# Altium footprint library Generic Footprint.PcbLib: 160 footprints (part 14 of 20) (continued)
## Symbol_FCC-Logo-1.5x1mm_silkscreen [mm] (continued)
1(0.814,0.325) 1(0.814,0.326) 1(0.814,0.328) 1(0.814,0.33) 1(0.814,0.748) 1(0.814,0.75) 1(0.814,0.753) 1(0.814,0.84) 1(0.814,0.843) 1(0.814,0.994) 1(0.814,0.998) 1(0.816,0.078) 1(0.816,0.082) 1(0.816,0.233) 1(0.816,0.235) 1(0.816,0.323) 1(0.816,0.325) 1(0.816,0.328) 1(0.816,0.75) 1(0.816,0.753) 1(0.816,0.755) 1(0.816,0.845) 1(0.816,0.996) 1(0.816,0.998) 1(0.816,1) 1(0.818,0.076) 1(0.818,0.082) 1(0.818,0.231) 1(0.818,0.233) 1(0.818,0.236) 1(0.818,0.321) 1(0.818,0.323) 1(0.818,0.325) 1(0.818,0.326) 1(0.818,0.753) 1(0.818,0.755) 1(0.818,0.756) 1(0.818,0.841) 1(0.818,0.843) 1(0.818,0.845) 1(0.818,0.996) 1(0.818,0.998) 1(0.819,0.078) 1(0.819,0.08) 1(0.819,0.229) 1(0.819,0.231) 1(0.819,0.233) 1(0.819,0.235) 1(0.819,0.32) 1(0.819,0.758) 1(0.819,0.843) 1(0.819,0.848) 1(0.819,0.998) 1(0.819,1) 1(0.819,1.001) 1(0.821,0.08) 1(0.821,0.228) 1(0.821,0.229) 1(0.821,0.231) 1(0.821,0.318) 1(0.821,0.321) 1(0.821,0.323) 1(0.821,0.755) 1(0.821,0.756) 1(0.821,0.76) 1(0.821,0.845) 1(0.821,0.848) 1(0.821,0.998) 1(0.823,0.075) 1(0.823,0.076) 1(0.823,0.078) 1(0.823,0.314) 1(0.823,0.316) 1(0.823,0.321) 1(0.823,0.756) 1(0.823,0.758) 1(0.823,0.76) 1(0.823,0.762) 1(0.823,1) 1(0.823,1.001) 1(0.823,1.003) 1(0.824,0.228) 1(0.824,0.313) 1(0.824,0.316) 1(0.824,0.758) 1(0.824,0.762) 1(0.824,0.763) 1(0.824,0.847) 1(0.826,0.229) 1(0.826,0.314) 1(0.826,0.316) 1(0.826,0.76) 1(0.826,0.762) 1(0.826,0.763) 1(0.826,0.765) 1(0.826,0.848) 1(0.826,1.001) 1(0.826,1.003) 1(0.826,1.005) 1(0.828,0.073) 1(0.828,0.075) 1(0.828,0.076) 1(0.828,0.311) 1(0.828,0.313) 1(0.828,0.767) 1(0.828,0.852) 1(0.83,0.228) 1(0.83,0.309) 1(0.83,0.311) 1(0.83,0.314) 1(0.83,0.763) 1(0.83,0.765) 1(0.83,0.768) 1(0.83,0.85) 1(0.83,0.852) 1(0.83,0.853) 1(0.83,1.003) 1(0.83,1.006) 1(0.831,0.071) 1(0.831,0.075) 1(0.831,0.226) 1(0.831,0.308) 1(0.831,0.309) 1(0.831,0.313) 1(0.831,0.765) 1(0.831,0.767) 1(0.831,0.77) 1(0.831,0.852) 1(0.831,0.853) 1(0.831,0.857) 1(0.833,0.073) 1(0.833,0.224) 1(0.833,0.306) 1(0.833,0.308) 1(0.833,0.311) 1(0.833,0.767) 1(0.833,0.77) 1(0.833,0.772) 1(0.833,0.853) 1(0.835,0.07) 1(0.835,0.073) 1(0.835,0.219) 1(0.835,0.304) 1(0.835,0.306) 1(0.835,0.308) 1(0.835,0.309) 1(0.835,0.77) 1(0.835,0.772) 1(0.835,0.773) 1(0.835,0.857) 1(0.835,0.858) 1(0.835,1.008) 1(0.836,0.068) 1(0.836,0.223) 1(0.836,0.303) 1(0.836,0.775) 1(0.836,0.855) 1(0.838,0.218) 1(0.838,0.219) 1(0.838,0.221) 1(0.838,0.304) 1(0.838,0.306) 1(0.838,0.772) 1(0.838,0.773) 1(0.838,0.857) 1(0.838,0.858) 1(0.838,0.86) 1(0.838,1.01) 1(0.84,0.066) 1(0.84,0.216) 1(0.84,0.299) 1(0.84,0.301) 1(0.84,0.303) 1(0.84,1.008) 1(0.841,0.216) 1(0.841,0.218) 1(0.841,0.219) 1(0.841,0.303) 1(0.841,0.304) 1(0.841,0.773) 1(0.841,0.775) 1(0.841,0.779) 1(0.841,0.858) 1(0.841,0.86) 1(0.841,1.008) 1(0.843,0.212) 1(0.843,0.218) 1(0.843,0.297) 1(0.843,0.299) 1(0.843,0.775) 1(0.843,0.777) 1(0.843,0.779) 1(0.843,0.78) 1(0.843,1.01) 1(0.843,1.011) 1(0.845,0.068) 1(0.845,0.296) 1(0.845,0.297) 1(0.845,0.782) 1(0.845,0.86) 1(0.846,0.065) 1(0.846,0.068) 1(0.846,0.212) 1(0.846,0.216) 1(0.846,0.299) 1(0.846,0.779) 1(0.846,0.78) 1(0.846,0.784) 1(0.846,0.862) 1(0.848,0.066) 1(0.848,0.211) 1(0.848,0.294) 1(0.848,0.297) 1(0.848,0.78) 1(0.848,0.782) 1(0.848,1.01) 1(0.848,1.011) 1(0.848,1.013) 1(0.85,0.214) 1(0.85,0.292) 1(0.85,0.296) 1(0.85,0.782) 1(0.85,0.785) 1(0.85,0.863) 1(0.85,0.867) 1(0.852,0.211) 1(0.852,0.289) 1(0.852,0.291) 1(0.852,0.292) 1(0.852,0.294) 1(0.852,0.296) 1(0.852,0.787) 1(0.852,0.867) 1(0.852,0.869) 1(0.852,1.011) 1(0.852,1.013) 1(0.852,1.015) 1(0.853,0.063) 1(0.853,0.066) 1(0.853,0.212) 1(0.853,0.294) 1(0.853,0.789) 1(0.853,0.865) 1(0.855,0.061) 1(0.855,0.065) 1(0.855,0.211) 1(0.855,0.287) 1(0.855,0.292) 1(0.855,0.787) 1(0.855,0.869) 1(0.855,1.017) 1(0.857,0.061) 1(0.857,0.065) 1(0.857,0.52) 1(0.857,0.522) 1(0.857,0.524) 1(0.857,0.525) 1(0.857,0.527) 1(0.857,0.529) 1(0.857,0.53) 1(0.857,0.532) 1(0.857,0.534) 1(0.857,0.535) 1(0.857,0.537) 1(0.857,0.539) 1(0.857,0.54) 1(0.857,0.542) 1(0.857,0.544) 1(0.857,0.546) 1(0.857,0.547) 1(0.857,0.549) 1(0.857,0.551) 1(0.857,0.552) 1(0.857,0.554) 1(0.857,0.556) 1(0.857,0.79) 1(0.857,0.867) 1(0.857,0.87) 1(0.857,0.872) 1(0.858,0.059) 1(0.858,0.063) 1(0.858,0.209) 1(0.858,0.286) 1(0.858,0.287) 1(0.858,0.289) 1(0.858,0.508) 1(0.858,0.51) 1(0.858,0.512) 1(0.858,0.513) 1(0.858,0.515) 1(0.858,0.517) 1(0.858,0.518) 1(0.858,0.522) 1(0.858,0.524) 1(0.858,0.525) 1(0.858,0.527) 1(0.858,0.529) 1(0.858,0.53) 1(0.858,0.532) 1(0.858,0.534) 1(0.858,0.535) 1(0.858,0.537) 1(0.858,0.539) 1(0.858,0.54) 1(0.858,0.542) 1(0.858,0.544) 1(0.858,0.546) 1(0.858,0.547) 1(0.858,0.549) 1(0.858,0.551) 1(0.858,0.552) 1(0.858,0.554) 1(0.858,0.556) 1(0.858,0.558) 1(0.858,0.559) 1(0.858,0.561) 1(0.858,0.563) 1(0.858,0.564) 1(0.858,0.566) 1(0.858,0.568) 1(0.858,0.569) 1(0.858,0.787) 1(0.858,0.789) 1(0.858,0.792) 1(0.858,0.869) 1(0.858,0.872) 1(0.858,1.013) 1(0.858,1.015) 1(0.858,1.017) 1(0.858,1.018) 1(0.86,0.204) 1(0.86,0.207) 1(0.86,0.289) 1(0.86,0.508) 1(0.86,0.51) 1(0.86,0.512) 1(0.86,0.513) 1(0.86,0.515) 1(0.86,0.517) 1(0.86,0.518) 1(0.86,0.522) 1(0.86,0.524) 1(0.86,0.525) 1(0.86,0.527) 1(0.86,0.529) 1(0.86,0.53) 1(0.86,0.532) 1(0.86,0.534) 1(0.86,0.535) 1(0.86,0.537) 1(0.86,0.539) 1(0.86,0.54) 1(0.86,0.542) 1(0.86,0.544) 1(0.86,0.546) 1(0.86,0.547) 1(0.86,0.549) 1(0.86,0.551) 1(0.86,0.552) 1(0.86,0.554) 1(0.86,0.556) 1(0.86,0.559) 1(0.86,0.561) 1(0.86,0.563) 1(0.86,0.564) 1(0.86,0.566) 1(0.86,0.568) 1(0.86,0.569) 1(0.86,0.789) 1(0.86,0.79) 1(0.86,0.794) 1(0.86,0.87) 1(0.86,0.874) 1(0.862,0.284) 1(0.862,0.508) 1(0.862,0.51) 1(0.862,0.512) 1(0.862,0.513) 1(0.862,0.515) 1(0.862,0.517) 1(0.862,0.561) 1(0.862,0.563) 1(0.862,0.564) 1(0.862,0.566) 1(0.862,0.568) 1(0.862,0.79) 1(0.862,0.792) 1(0.862,0.796) 1(0.862,0.87) 1(0.862,1.015) 1(0.862,1.017) 1(0.864,0.058) 1(0.864,0.059) 1(0.864,0.061) 1(0.864,0.063) 1(0.864,0.202) 1(0.864,0.204) 1(0.864,0.206) 1(0.864,0.282) 1(0.864,0.287) 1(0.864,0.486) 1(0.864,0.49) 1(0.864,0.518) 1(0.864,0.559) 1(0.864,0.569) 1(0.864,0.588) 1(0.864,0.592) 1(0.864,0.794) 1(0.864,0.874) 1(0.864,0.875) 1(0.864,1.02) 1(0.865,0.28) 1(0.865,0.282) 1(0.865,0.284) 1(0.865,0.479) 1(0.865,0.481) 1(0.865,0.483) 1(0.865,0.486) 1(0.865,0.49) 1(0.865,0.498) 1(0.865,0.5) 1(0.865,0.501) 1(0.865,0.503) 1(0.865,0.505) 1(0.865,0.507) 1(0.865,0.571) 1(0.865,0.573) 1(0.865,0.575) 1(0.865,0.576) 1(0.865,0.578) 1(0.865,0.588) 1(0.865,0.592) 1(0.865,0.593) 1(0.865,0.595) 1(0.865,0.597) 1(0.865,0.598) 1(0.865,0.792) 1(0.865,0.794) 1(0.865,0.797) 1(0.865,0.872) 1(0.865,0.875) 1(0.865,0.877) 1(0.867,0.201) 1(0.867,0.204) 1(0.867,0.474) 1(0.867,0.476) 1(0.867,0.478) 1(0.867,0.479) 1(0.867,0.481) 1(0.867,0.483) 1(0.867,0.491) 1(0.867,0.493) 1(0.867,0.495) 1(0.867,0.496) 1(0.867,0.58) 1(0.867,0.581) 1(0.867,0.583) 1(0.867,0.585) 1(0.867,0.586) 1(0.867,0.593) 1(0.867,0.595) 1(0.867,0.597) 1(0.867,0.598) 1(0.867,0.6) 1(0.867,0.602) 1(0.867,0.603) 1(0.867,0.799) 1(0.867,0.874) 1(0.867,1.022) 1(0.869,0.056) 1(0.869,0.058) 1(0.869,0.059) 1(0.869,0.202) 1(0.869,0.279) 1(0.869,0.28) 1(0.869,0.282) 1(0.869,0.284) 1(0.869,0.471) 1(0.869,0.473) 1(0.869,0.474) 1(0.869,0.476) 1(0.869,0.478) 1(0.869,0.483) 1(0.869,0.484) 1(0.869,0.486) 1(0.869,0.488) 1(0.869,0.49) 1(0.869,0.588) 1(0.869,0.59) 1(0.869,0.592) 1(0.869,0.593) 1(0.869,0.595) 1(0.869,0.6) 1(0.869,0.602) 1(0.869,0.603) 1(0.869,0.605) 1(0.869,0.607) 1(0.869,0.877) 1(0.87,0.201) 1(0.87,0.277) 1(0.87,0.469) 1(0.87,0.474) 1(0.87,0.478) 1(0.87,0.479) 1(0.87,0.481) 1(0.87,0.597) 1(0.87,0.598) 1(0.87,0.6) 1(0.87,0.603) 1(0.87,0.609) 1(0.87,0.801) 1(0.872,0.197) 1(0.872,0.199) 1(0.872,0.202) 1(0.872,0.279) 1(0.872,0.28) 1(0.872,0.466) 1(0.872,0.467) 1(0.872,0.469) 1(0.872,0.471) 1(0.872,0.473) 1(0.872,0.476) 1(0.872,0.602) 1(0.872,0.605) 1(0.872,0.607) 1(0.872,0.61) 1(0.872,0.612) 1(0.872,0.799) 1(0.872,0.875) 1(0.874,0.058) 1(0.874,0.197) 1(0.874,0.199) 1(0.874,0.462) 1(0.874,0.464) 1(0.874,0.466) 1(0.874,0.469) 1(0.874,0.471) 1(0.874,0.473) 1(0.874,0.605) 1(0.874,0.607) 1(0.874,0.61) 1(0.874,0.614) 1(0.874,0.615) 1(0.874,0.802) 1(0.874,1.023) 1(0.875,0.054) 1(0.875,0.195) 1(0.875,0.197) 1(0.875,0.201) 1(0.875,0.274) 1(0.875,0.275) 1(0.875,0.279) 1(0.875,0.461) 1(0.875,0.462) 1(0.875,0.464) 1(0.875,0.466) 1(0.875,0.61) 1(0.875,0.614) 1(0.875,0.615) 1(0.875,0.617) 1(0.875,0.799) 1(0.875,0.877) 1(0.877,0.053) 1(0.877,0.197) 1(0.877,0.199) 1(0.877,0.272) 1(0.877,0.462) 1(0.877,0.464) 1(0.877,0.614) 1(0.877,0.615) 1(0.877,0.802) 1(0.877,0.804) 1(0.877,0.806) 1(0.877,0.879) 1(0.877,1.025) 1(0.879,0.051) 1(0.879,0.195) 1(0.879,0.452) 1(0.879,0.457) 1(0.879,0.62) 1(0.879,0.804) 1(0.879,1.022) 1(0.881,0.27) 1(0.881,0.447) 1(0.881,0.449) 1(0.881,0.45) 1(0.881,0.452) 1(0.881,0.459) 1(0.881,0.619) 1(0.881,0.627) 1(0.881,0.629) 1(0.881,0.631) 1(0.881,0.802) 1(0.881,0.806) 1(0.881,0.882) 1(0.882,0.197) 1(0.882,0.272) 1(0.882,0.445) 1(0.882,0.449) 1(0.882,0.45) 1(0.882,0.452) 1(0.882,0.454) 1(0.882,0.455) 1(0.882,0.622) 1(0.882,0.624) 1(0.882,0.627) 1(0.882,0.629) 1(0.882,0.632) 1(0.882,0.634) 1(0.882,0.804) 1(0.882,0.807) 1(0.882,0.881) 1(0.882,0.882) 1(0.882,0.884) 1(0.882,1.022) 1(0.884,0.442) 1(0.884,0.444) 1(0.884,0.445) 1(0.884,0.447) 1(0.884,0.449) 1(0.884,0.45) 1(0.884,0.626) 1(0.884,0.627) 1(0.884,0.632) 1(0.884,0.636) 1(0.884,1.023) 1(0.884,1.025) 1(0.884,1.027) 1(0.886,0.195) 1(0.886,0.269) 1(0.886,0.27) 1(0.886,0.272) 1(0.886,0.442) 1(0.886,0.444) 1(0.886,0.445) 1(0.886,0.447) 1(0.886,0.629) 1(0.886,0.632) 1(0.886,0.634) 1(0.886,0.637) 1(0.886,0.806) 1(0.886,0.807) 1(0.886,0.809) 1(0.886,0.882) 1(0.886,0.884) 1(0.886,0.886) 1(0.887,0.049) 1(0.887,0.192) 1(0.887,0.439) 1(0.887,0.44) 1(0.887,0.444) 1(0.887,0.639) 1(0.889,0.19) 1(0.889,0.192) 1(0.889,0.194) 1(0.889,0.269) 1(0.889,0.27) 1(0.889,0.435) 1(0.889,0.437) 1(0.889,0.439) 1(0.889,0.442) 1(0.889,0.634) 1(0.889,0.639) 1(0.889,0.641) 1(0.889,0.643) 1(0.889,0.807) 1(0.889,0.811) 1(0.889,0.884) 1(0.889,0.886) 1(0.889,0.887) 1(0.889,1.023) 1(0.889,1.027) 1(0.889,1.028) 1(0.891,0.189) 1(0.891,0.265) 1(0.891,0.435) 1(0.891,0.437) 1(0.891,0.439) 1(0.891,0.641) 1(0.891,0.813) 1(0.891,0.889) 1(0.891,1.025) 1(0.892,0.051) 1(0.892,0.263) 1(0.892,0.267) 1(0.892,0.269) 1(0.892,0.435) 1(0.892,0.437) 1(0.892,0.639) 1(0.892,0.641) 1(0.892,0.813) 1(0.892,0.814) 1(0.892,0.886) 1(0.894,0.192) 1(0.894,0.265) 1(0.894,0.267) 1(0.894,0.433) 1(0.894,0.813) 1(0.894,0.887) 1(0.894,0.889) 1(0.894,0.891) 1(0.894,1.03) 1(0.896,0.047) 1(0.896,0.051) 1(0.896,0.187) 1(0.896,0.189) 1(0.896,0.262) 1(0.896,0.267) 1(0.896,0.427) 1(0.896,0.644) 1(0.896,0.648) 1(0.896,0.651) 1(0.896,0.816) 1(0.896,0.887) 1(0.896,1.027) 1(0.896,1.028) 1(0.897,0.049) 1(0.897,0.263) 1(0.897,0.265) 1(0.897,0.423) 1(0.897,0.425) 1(0.897,0.432) 1(0.897,0.646) 1(0.897,0.649) 1(0.897,0.651) 1(0.897,0.653) 1(0.897,0.814) 1(0.899,0.185) 1(0.899,0.187) 1(0.899,0.189) 1(0.899,0.422) 1(0.899,0.425) 1(0.899,0.428) 1(0.899,0.43) 1(0.899,0.651) 1(0.899,0.653) 1(0.899,0.654) 1(0.899,0.656) 1(0.899,0.818) 1(0.899,0.891) 1(0.899,0.892) 1(0.901,0.26) 1(0.901,0.263) 1(0.901,0.418) 1(0.901,0.42) 1(0.901,0.423) 1(0.901,0.425) 1(0.901,0.653) 1(0.901,0.654) 1(0.901,0.656) 1(0.901,0.658) 1(0.901,0.659) 1(0.901,0.889) 1(0.903,0.046) 1(0.903,0.047) 1(0.903,0.049) 1(0.903,0.184) 1(0.903,0.185) 1(0.903,0.42) 1(0.903,0.422) 1(0.903,0.423) 1(0.903,0.654) 1(0.903,0.656) 1(0.903,0.658) 1(0.903,0.659) 1(0.903,0.814) 1(0.903,0.816) 1(0.903,0.892) 1(0.903,1.028) 1(0.903,1.03) 1(0.903,1.032) 1(0.904,0.046) 1(0.904,0.187) 1(0.904,0.258) 1(0.904,0.262) 1(0.904,0.416) 1(0.904,0.422) 1(0.904,0.658) 1(0.904,0.661) 1(0.904,0.819) 1(0.906,0.046) 1(0.906,0.257) 1(0.906,0.262) 1(0.906,0.416) 1(0.906,0.42) 1(0.906,0.659) 1(0.906,0.661) 1(0.906,0.663) 1(0.906,0.816) 1(0.906,0.818) 1(0.908,0.044) 1(0.908,0.182) 1(0.908,0.184) 1(0.908,0.416) 1(0.908,0.661) 1(0.908,0.663) 1(0.908,0.665) 1(0.908,0.819) 1(0.908,0.821) 1(0.908,0.891) 1(0.908,1.034) 1(0.909,0.042) 1(0.909,0.047) 1(0.909,0.18) 1(0.909,0.185) 1(0.909,0.258) 1(0.909,0.26) 1(0.909,0.411) 1(0.909,0.415) 1(0.909,0.663) 1(0.909,0.665) 1(0.909,0.666) 1(0.909,0.668) 1(0.909,0.818) 1(0.909,0.819) 1(0.909,0.821) 1(0.909,0.823) 1(0.909,1.03) 1(0.909,1.035) 1(0.911,0.044) 1(0.911,0.046) 1(0.911,0.255) 1(0.911,0.257) 1(0.911,0.258) 1(0.911,0.26) 1(0.911,0.408) 1(0.911,0.41) 1(0.911,0.411) 1(0.911,0.413) 1(0.911,0.665) 1(0.911,0.666) 1(0.911,0.819) 1(0.911,0.892) 1(0.913,0.18) 1(0.913,0.182) 1(0.913,0.41) 1(0.913,0.411) 1(0.913,0.666) 1(0.913,0.668) 1(0.913,0.67) 1(0.915,0.184) 1(0.915,0.253) 1(0.915,0.255) 1(0.915,0.405) 1(0.915,0.406) 1(0.915,0.408) 1(0.915,0.41) 1(0.915,0.668) 1(0.915,0.67) 1(0.915,0.671) 1(0.915,0.819) 1(0.915,0.821) 1(0.915,0.823) 1(0.916,0.046) 1(0.916,0.257) 1(0.916,0.403) 1(0.916,0.406) 1(0.916,0.408) 1(0.916,0.67) 1(0.916,0.671) 1(0.916,0.673) 1(0.916,0.824) 1(0.916,0.894) 1(0.916,1.037) 1(0.918,0.041) 1(0.918,0.042) 1(0.918,0.044) 1(0.918,0.182) 1(0.918,0.403) 1(0.918,0.405) 1(0.918,0.406) 1(0.918,0.671) 1(0.918,0.673) 1(0.918,0.896) 1(0.918,0.899) 1(0.92,0.251) 1(0.92,0.253) 1(0.92,0.255) 1(0.92,0.405) 1(0.92,0.673) 1(0.92,0.823) 1(0.92,0.824) 1(0.92,0.826) 1(0.921,0.403) 1(0.921,0.675) 1(0.921,0.678) 1(0.923,0.177) 1(0.923,0.18) 1(0.923,0.677) 1(0.923,0.678) 1(0.923,0.68) 1(0.923,0.824) 1(0.923,0.828) 1(0.923,0.898) 1(0.923,0.899) 1(0.923,0.901) 1(0.923,1.035) 1(0.925,0.039) 1(0.925,0.042) 1(0.925,0.248) 1(0.925,0.25) 1(0.925,0.251) 1(0.925,0.253) 1(0.925,0.398) 1(0.925,0.401) 1(0.925,0.83) 1(0.925,1.035) 1(0.925,1.039) 1(0.926,0.398) 1(0.926,0.399) 1(0.926,0.678) 1(0.926,0.68) 1(0.926,0.682) 1(0.928,0.246) 1(0.928,0.248) 1(0.928,0.25) 1(0.928,0.251) 1(0.928,0.682) 1(0.928,0.683) 1(0.928,0.831) 1(0.928,0.901) 1(0.928,0.903) 1(0.928,1.035) 1(0.93,0.175) 1(0.93,0.177) 1(0.93,0.248) 1(0.93,0.25) 1(0.93,0.396) 1(0.93,0.398) 1(0.93,0.68) 1(0.93,0.683) 1(0.93,0.899) 1(0.93,1.035) 1(0.931,0.178) 1(0.931,0.391) 1(0.931,0.393) 1(0.931,0.394) 1(0.931,0.682) 1(0.931,0.683) 1(0.931,1.037) 1(0.933,0.389) 1(0.933,0.393) 1(0.933,0.904) 1(0.933,1.04) 1(0.935,0.037) 1(0.935,0.173) 1(0.935,0.245) 1(0.935,0.391) 1(0.935,0.393) 1(0.935,0.685) 1(0.935,0.83) 1(0.935,0.833) 1(0.935,0.901) 1(0.935,0.903) 1(0.935,0.906) 1(0.935,1.04) 1(0.937,0.172) 1(0.937,0.175) 1(0.937,0.177) 1(0.937,0.389) 1(0.937,0.391) 1(0.937,0.83) 1(0.938,0.687) 1(0.938,0.69) 1(0.938,0.831) 1(0.94,0.243) 1(0.94,0.69) 1(0.94,1.037) 1(0.94,1.04) 1(0.942,0.036) 1(0.942,0.389) 1(0.942,0.688) 1(0.942,0.694) 1(0.942,0.831) 1(0.942,0.903) 1(0.942,0.904) 1(0.942,0.906) 1(0.942,1.039) 1(0.942,1.042) 1(0.943,0.17) 1(0.943,0.172) 1(0.943,0.173) 1(0.943,0.175) 1(0.943,0.386) 1(0.943,0.388) 1(0.943,0.69) 1(0.943,0.694) 1(0.943,0.695) 1(0.943,0.833) 1(0.943,0.835) 1(0.943,0.908) 1(0.945,0.173) 1(0.945,0.241) 1(0.945,0.245) 1(0.945,0.382) 1(0.945,0.692) 1(0.947,0.381) 1(0.947,0.382) 1(0.947,0.384) 1(0.947,0.695) 1(0.947,0.697) 1(0.949,0.17) 1(0.949,0.245) 1(0.949,0.694) 1(0.949,0.697) 1(0.949,0.699) 1(0.949,0.833) 1(0.949,0.835) 1(0.949,0.904) 1(0.949,0.908) 1(0.95,0.168) 1(0.95,0.172) 1(0.95,0.379) 1(0.95,0.381) 1(0.95,0.695) 1(0.95,0.838) 1(0.95,0.909) 1(0.95,1.039) 1(0.95,1.04) 1(0.95,1.042) 1(0.95,1.044) 1(0.952,0.034) 1(0.952,0.24) 1(0.952,0.243) 1(0.952,0.377) 1(0.952,0.381) 1(0.952,0.382) 1(0.954,0.036) 1(0.954,0.037) 1(0.954,0.376) 1(0.954,0.379) 1(0.954,0.697) 1(0.954,0.699) 1(0.954,0.909) 1(0.955,0.037) 1(0.955,0.238) 1(0.955,0.24) 1(0.955,0.243) 1(0.955,0.835) 1(0.955,0.838) 1(0.957,0.241) 1(0.957,0.374) 1(0.957,0.376) 1(0.957,0.379) 1(0.957,0.699) 1(0.957,0.84) 1(0.957,0.906) 1(0.959,0.037) 1(0.959,0.166) 1(0.959,0.168) 1(0.96,0.17) 1(0.96,0.372) 1(0.96,0.374) 1(0.96,0.7) 1(0.96,0.836) 1(0.96,1.04) 1(0.962,0.036) 1(0.962,0.037) 1(0.962,0.241) 1(0.962,0.376) 1(0.962,0.838) 1(0.962,0.84) 1(0.962,0.841) 1(0.962,1.042) 1(0.962,1.044) 1(0.962,1.045) 1(0.964,0.032) 1(0.964,0.034) 1(0.964,0.236) 1(0.964,0.238) 1(0.964,0.24) 1(0.964,0.372) 1(0.964,0.702) 1(0.964,0.705) 1(0.966,0.166) 1(0.966,0.371) 1(0.966,0.908) 1(0.967,0.371) 1(0.967,0.374) 1(0.967,0.704) 1(0.967,0.705) 1(0.967,0.707) 1(0.967,0.911) 1(0.969,0.84) 1(0.969,0.843) 1(0.971,0.235) 1(0.971,0.236) 1(0.971,0.238) 1(0.971,0.709) 1(0.971,0.911) 1(0.972,0.705) 1(0.972,0.707) 1(0.972,0.711) 1(0.972,0.911) 1(0.972,1.047) 1(0.974,0.372) 1(0.974,0.911) 1(0.974,1.044) 1(0.974,1.045) 1(0.976,0.168) 1(0.976,0.371) 1(0.976,0.707) 1(0.976,0.709) 1(0.976,0.711) 1(0.976,0.909) 1(0.976,0.913) 1(0.976,0.915) 1(0.977,0.031) 1(0.977,0.032) 1(0.977,0.034) 1(0.977,0.365) 1(0.977,0.369) 1(0.977,0.712) 1(0.979,0.709) 1(0.979,0.841) 1(0.979,0.845) 1(0.981,0.233) 1(0.981,0.235) 1(0.981,0.236) 1(0.981,0.711) 1(0.981,0.712) 1(0.981,0.714) 1(0.981,0.841) 1(0.982,0.231) 1(0.982,0.364) 1(0.982,0.365) 1(0.982,0.367) 1(0.982,0.841) 1(0.986,0.714) 1(0.986,0.841) 1(0.986,0.911) 1(0.986,0.915) 1(0.986,0.916) 1(0.988,0.166) 1(0.988,0.362) 1(0.988,0.364) 1(0.988,0.712) 1(0.988,0.716) 1(0.988,0.847) 1(0.989,0.161) 1(0.989,0.165) 1(0.989,0.229) 1(0.989,0.235) 1(0.989,0.365) 1(0.989,0.716) 1(0.989,0.843) 1(0.989,1.045) 1(0.989,1.049) 1(0.991,0.029) 1(0.991,0.032) 1(0.991,0.161) 1(0.991,0.716) 1(0.993,0.031) 1(0.993,0.36) 1(0.993,0.716) 1(0.993,0.843) 1(0.994,0.161) 1(0.994,0.359) 1(0.994,0.362) 1(0.994,0.364) 1(0.996,0.843) 1(0.998,0.843) 1(0.998,0.848) 1(1,0.161) 1(1,0.847) 1(1.001,0.161) 1(1.001,0.359) 1(1.001,0.36) 1(1.001,0.362) 1(1.001,0.714) 1(1.001,0.915) 1(1.001,0.916) 1(1.001,0.918) 1(1.003,0.161) 1(1.003,0.228) 1(1.003,0.357) 1(1.005,0.16) 1(1.005,0.163) 1(1.008,0.357) 1(1.01,0.357) 1(1.01,0.716) 1(1.01,1.051) 1(1.011,0.357) 1(1.011,0.36) 1(1.011,0.717) 1(1.011,0.721) 1(1.013,1.052) 1(1.015,0.355) 1(1.015,0.847) 1(1.015,0.848) 1(1.015,0.85) 1(1.016,0.355) 1(1.018,0.025) 1(1.018,0.027) 1(1.018,0.029) 1(1.018,0.031) 1(1.02,0.226) 1(1.02,0.229) 1(1.02,0.355) 1(1.023,0.355) 1(1.025,0.355) 1(1.025,0.719) 1(1.025,0.721) 1(1.025,0.722) 1(1.027,0.359) 1(1.028,0.355) 1(1.028,0.916) 1(1.03,0.918) 1(1.03,0.92) 1(1.054,0.916) 1(1.056,0.918) 1(1.056,0.92) 1(1.057,0.355) 1(1.057,0.359) 1(1.059,0.355) 1(1.061,0.719) 1(1.061,0.721) 1(1.061,0.722) 1(1.062,0.226) 1(1.062,0.229) 1(1.062,0.355) 1(1.064,0.029) 1(1.066,0.025) 1(1.066,0.031) 1(1.066,0.355) 1(1.068,0.027) 1(1.068,0.355) 1(1.068,0.847) 1(1.068,0.848) 1(1.069,0.85) 1(1.071,0.355) 1(1.071,1.052) 1(1.073,0.357) 1(1.073,0.36) 1(1.073,1.051) 1(1.074,0.357) 1(1.074,0.717) 1(1.074,0.721) 1(1.076,0.716) 1(1.078,0.357) 1(1.079,0.16) 1(1.079,0.161) 1(1.079,0.163) 1(1.081,0.161) 1(1.081,0.228) 1(1.081,0.357) 1(1.083,0.161) 1(1.083,0.359) 1(1.083,0.36) 1(1.083,0.362) 1(1.083,0.915) 1(1.083,0.916) 1(1.083,0.918) 1(1.085,0.845) 1(1.085,0.847) 1(1.086,0.843) 1(1.086,0.848) 1(1.088,0.714) 1(1.088,0.845) 1(1.09,0.161) 1(1.09,0.359) 1(1.09,0.36) 1(1.09,0.362) 1(1.09,0.364) 1(1.09,0.843) 1(1.091,0.161) 1(1.093,0.029) 1(1.093,0.031) 1(1.093,0.032) 1(1.093,0.161) 1(1.093,0.229) 1(1.093,0.843) 1(1.093,1.045) 1(1.095,0.165) 1(1.095,0.235) 1(1.095,0.712) 1(1.095,0.716) 1(1.095,0.843) 1(1.095,1.049) 1(1.096,0.166) 1(1.096,0.362) 1(1.096,0.364) 1(1.096,0.365) 1(1.096,0.712) 1(1.096,0.847) 1(1.098,0.712) 1(1.098,0.716) 1(1.098,0.841) 1(1.098,0.911) 1(1.098,0.915) 1(1.098,0.916) 1(1.1,0.714) 1(1.1,0.841) 1(1.101,0.364) 1(1.101,0.365) 1(1.101,0.367) 1(1.101,0.841) 1(1.103,0.231) 1(1.103,0.233) 1(1.103,0.235) 1(1.103,0.236) 1(1.103,0.843) 1(1.105,0.711) 1(1.105,0.712) 1(1.105,0.714) 1(1.105,0.841) 1(1.105,0.843) 1(1.105,0.845) 1(1.107,0.168) 1(1.107,0.365) 1(1.107,0.367) 1(1.107,0.369) 1(1.107,0.371) 1(1.108,0.032) 1(1.108,0.034) 1(1.108,0.367) 1(1.108,0.909) 1(1.108,0.915) 1(1.108,1.044) 1(1.108,1.045) 1(1.11,0.031) 1(1.11,0.711) 1(1.11,0.712) 1(1.11,0.913) 1(1.11,1.047) 1(1.112,0.236) 1(1.112,0.372) 1(1.112,0.707) 1(1.113,0.235) 1(1.113,0.238) 1(1.113,0.84) 1(1.115,0.711) 1(1.115,0.843) 1(1.115,0.911) 1(1.117,0.371) 1(1.117,0.374) 1(1.117,0.705) 1(1.117,0.707) 1(1.117,0.709) 1(1.117,0.911) 1(1.119,0.166) 1(1.119,0.371) 1(1.119,0.908) 1(1.12,0.236) 1(1.12,0.238) 1(1.12,0.24) 1(1.12,0.372) 1(1.12,0.376) 1(1.12,0.704) 1(1.12,0.705) 1(1.12,0.707) 1(1.12,0.84) 1(1.122,0.034) 1(1.122,0.036) 